# Altium footprint library ACTION标准库.pcblib: 504 footprints (part 14 of 32)
Each footprint in its own frame and in the unit in brackets; x right, y up, seen from the top. Pads: shape width x height; smd on the part's side, far side on the other; paste and mask are expansions set on the pad; w line width, h text height; cw(c..) or ccw(c..) is an arc to the next point about the centre after c.
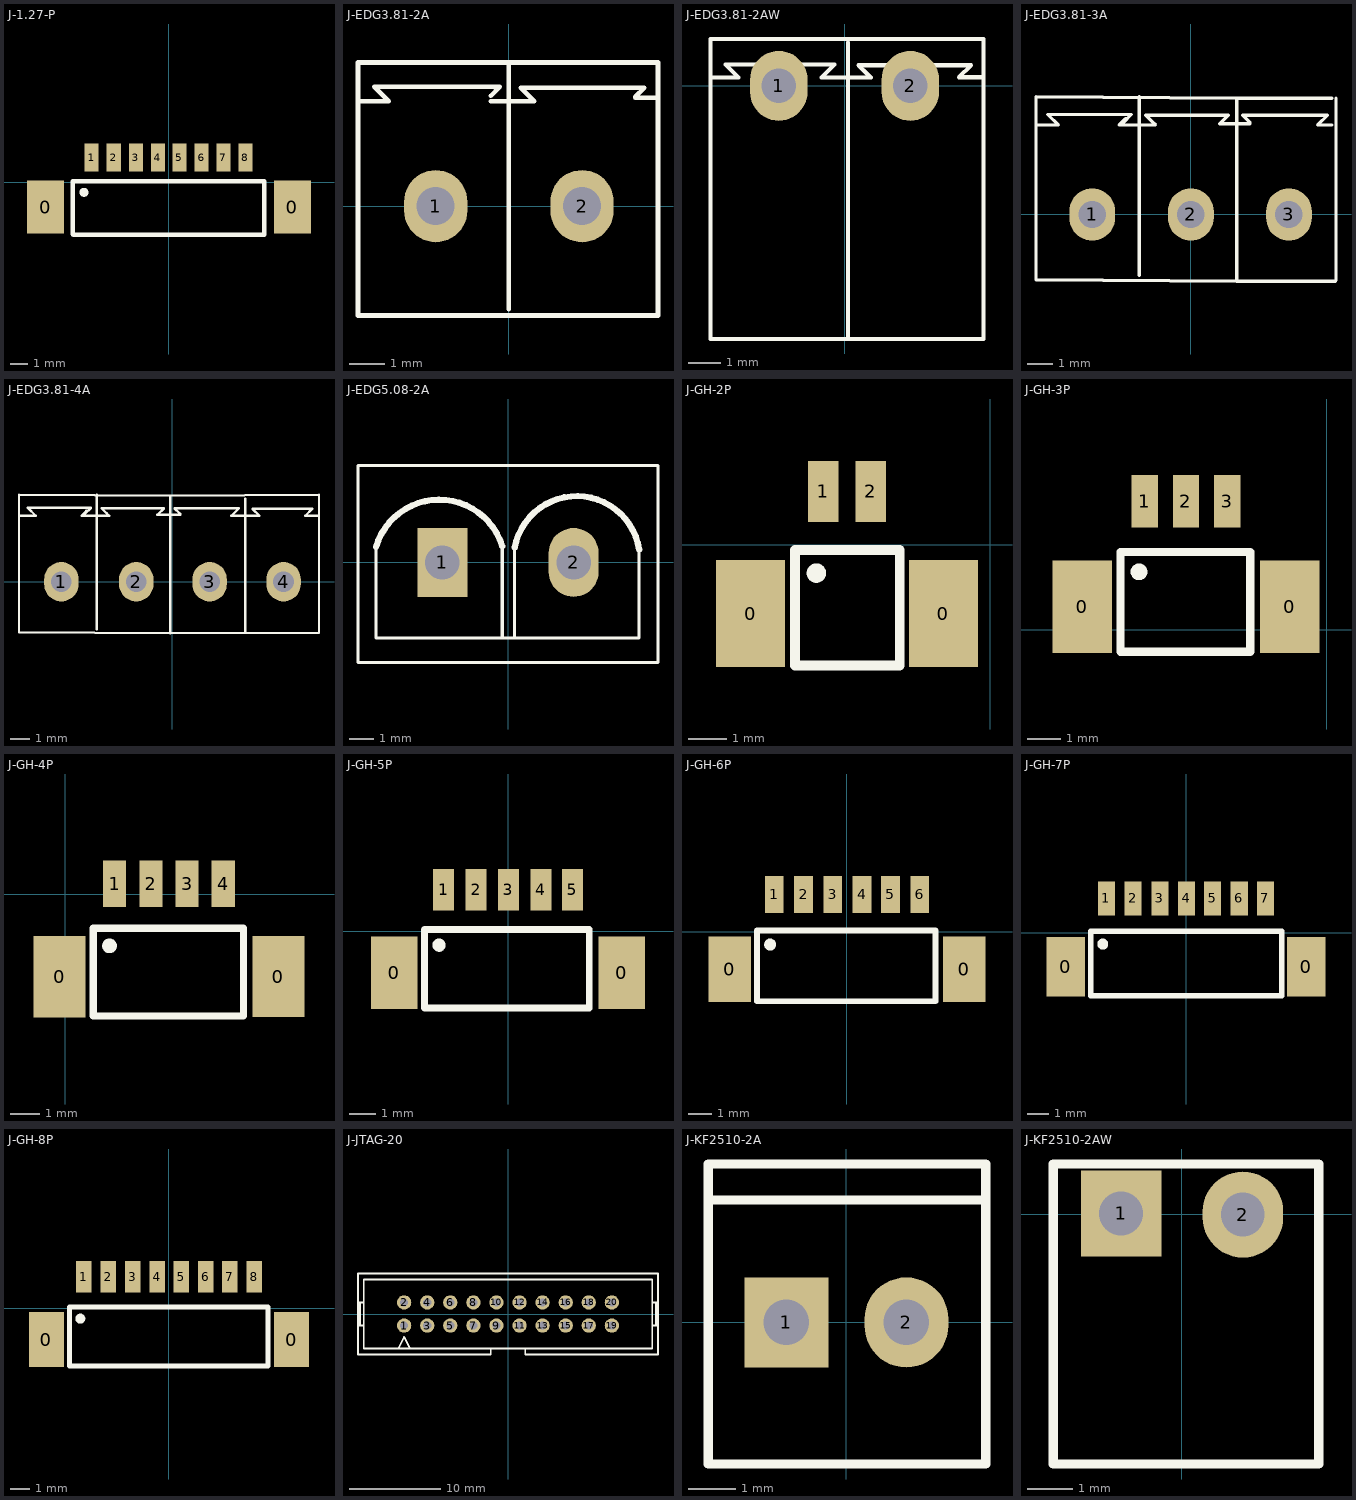
[diagram p13: the footprints below, top view; thin cyan lines are the x and y axes]

## J-1.27-P [mm]
pads (10):
  rect 2.1x3 smd: 0(-6.972,-1.399) 0(6.972,-1.402)
  rect 0.8x1.6 smd: 1(-4.371,1.402) 2(-3.121,1.402) 3(-1.871,1.402) 4(-0.622,1.402) 5(0.592,1.402) 6(1.842,1.402) 7(3.069,1.402) 8(4.319,1.402)
Top Overlay:
  circle w0.254: c-4.801,-0.564 r0.127
  lines w0.254: -5.436,-2.928 -5.411,-2.954 5.371,-2.954 5.371,0.069 -5.436,0.069 -5.436,-2.928
3D body "CH1.25-8P-SMD.STEP": height 3.5, standoff 0, extent -7.779,-3.699 7.371,1.501

## J-EDG3.81-2A [mil]
pads (2):
  oval 70x80 hole 42: 1(-81,0) 2(81,0)
Top Overlay:
  lines w5: -167,116 -133,116 -149,132 -10,132 -20,122 ; -20,116 16,116 28,116 23,121 13,131 150,131 140,121 140,120 164,120 ; 0,-114 0,159 ; -167,-121 165,-121 165,159 -167,159 -167,-121
3D body "小绿头2.STEP": height 354.33, standoff -137.8, extent -168,-122 166.65,158

## J-EDG3.81-2AW [mil]
height 68.9
pads (2):
  oval 70x85 hole 42: 1(-80,0) 2(80,0)
Top Overlay:
  lines w5: -163,10 -129,10 -145,26 -12,26 -28,10 32,10 27,15 17,25 154,25 139.5,10.5 167.5,10.5 ; 4,-305 4,53 ; -163,-308 169,-308 169,57 -163,57 -163,-308
3D body "66361.stp": height 287.4, standoff -102.36, extent -173.99,-305.55 180.74,56.66

## J-EDG3.81-3A [mil]
pads (3):
  oval 70x80 hole 42: 1(-151,0) 2(0,0) 3(150,0)
Top Overlay:
  lines w5: -237,137 -203,137 -219,153 -104,153 -91,153 -103,141 ; -97.22,146.78 -100.22,146.78 -110,137 -90,137 -54,137 -59,142 -69,152 57,152 44,139 90,139 90,141 79,152 209,152 194,137 216,137 ; -79,-93 -79,180 ; 70,141 70,142 ; 216,178 70,178 ; 221,-102 70,-102 ; 222,-101 222,172 222,178 ; 70,-102 70,178 ; 70,-102 -237,-100 -237,180 70,178
3D body "3-3.81修改.STEP": height 354.33, standoff -118.11, extent -250.99,-109.56 238.99,193

## J-EDG3.81-4A [mil]
pads (4):
  oval 70x80 hole 42: 1(-225.5,0) 2(-73.5,0) 3(75.5,0) 4(225.5,0)
Top Overlay:
  lines w5: -311.5,134 -277.5,134 -293.5,150 -178.5,150 -165.5,150 -177.5,138 ; -171.72,143.78 -174.72,143.78 -184.5,134 -164.5,134 -128.5,134 -133.5,139 -143.5,149 -17.5,149 -30.5,136 15.5,136 15.5,138 4.5,149 134.5,149 119.5,134 176.5,134 162.5,148 283.5,148 269.5,134 297.5,134 ; -153.5,-96 -153.5,177 ; -4.5,138 -4.5,139 ; 147.5,-104 147.5,169 ; -4.5,-105 297.5,-103.31 297.5,176.69 -4.5,175 ; -4.5,-105 -311.5,-103 -311.5,177 -4.5,175 ; -4.5,-105 -4.5,175

## J-EDG5.08-2A [mil]
pads (2):
  rect 80x110.24 hole 55: 1(-105,0)
  oval 80x110.24 hole 55: 2(105,0)
Top Overlay:
  lines w5: -211.19,24.76 -211.19,-120.81 209.88,-120.81 209.88,20.77 ; -9.19,-117.62 -9.19,26.02 ; 10.67,-120.81 10.67,23.92 ; -240,-160 240,-160 240,155 -30,155 -240,155 -240,-160
  lines w10: -211.19,24.76 cw(c-110,-5) -9.19,26.02 ; 10.67,23.92 cw(c110,5) 209.88,20.77
3D body "大绿头.STEP": height 354.33, standoff -39.37, extent -234.22,-157.96 238.22,157

## J-GH-2P [mm]
pads (4):
  rect 1.8x2.8 smd: 0(-6.27,-1.8) 0(-1.221,-1.8)
  rect 0.8x1.6 smd: 1(-4.371,1.402) 2(-3.121,1.402)
Top Overlay:
  circle w0.254: c-4.547,-0.737 r0.127
  lines w0.254: -5.105,-3.157 -5.105,-0.134 -2.362,-0.134 -2.362,-3.157 -5.105,-3.157
3D body "SM02B-GHS-TB.stp": height 4.25, standoff -0.05, extent -6.639,-3.224 -0.889,1.626

## J-GH-3P [mm]
pads (5):
  rect 1.8x2.8 smd: 0(-7.413,0.689) 0(-1.114,0.691)
  rect 0.8x1.6 smd: 1(-5.514,3.891) 2(-4.264,3.891) 3(-3.014,3.891)
Top Overlay:
  circle w0.254: c-5.69,1.753 r0.127
  lines w0.254: -6.248,-0.668 -2.311,-0.668 -2.311,2.355 -6.248,2.355 -6.248,-0.668

## J-GH-4P [mm]
pads (6):
  rect 1.8x2.8 smd: 0(-0.199,-2.841) 0(7.349,-2.839)
  rect 0.8x1.6 smd: 1(1.699,0.361) 2(2.949,0.361) 3(4.199,0.361) 4(5.449,0.361)
Top Overlay:
  circle w0.254: c1.524,-1.778 r0.127
  lines w0.254: 0.965,-4.198 6.147,-4.198 6.147,-1.176 0.965,-1.176 0.965,-4.198
3D body "SM04B-GHS-TB.stp": height 4.25, standoff -0.05, extent -0.503,-4.266 7.747,0.584

## J-GH-5P [mm]
pads (7):
  rect 1.8x2.8 smd: 0(-4.381,-1.601) 0(4.381,-1.599)
  rect 0.8x1.6 smd: 1(-2.483,1.601) 2(-1.233,1.601) 3(0.017,1.601) 4(1.267,1.601) 5(2.481,1.601)
Top Overlay:
  circle w0.254: c-2.658,-0.538 r0.127
  lines w0.254: -3.217,-2.958 3.133,-2.958 3.133,0.065 -3.217,0.065 -3.217,-2.958
3D body "SM05B-GHS-TB.stp": height 4.35, standoff 0.05, extent -4.724,-3.015 4.776,1.835

## J-GH-6P [mm]
pads (8):
  rect 1.8x2.8 smd: 0(-5.006,-1.601) 0(5.006,-1.599)
  rect 0.8x1.6 smd: 1(-3.108,1.601) 2(-1.858,1.601) 3(-0.608,1.601) 4(0.642,1.601) 5(1.856,1.601) 6(3.106,1.601)
Top Overlay:
  circle w0.254: c-3.283,-0.538 r0.127
  lines w0.254: -3.842,-2.958 -3.842,0.065 3.778,0.065 3.778,-2.958 -3.842,-2.958
3D body "SM06B-GHS-TB.stp": height 4.45, standoff 0.15, extent -5.289,-2.996 5.461,1.854

## J-GH-7P [mm]
pads (9):
  rect 1.8x2.8 smd: 0(-5.619,-1.601) 0(5.619,-1.599)
  rect 0.8x1.6 smd: 1(-3.721,1.601) 2(-2.471,1.601) 3(-1.221,1.601) 4(0.029,1.601) 5(1.243,1.601) 6(2.493,1.601) 7(3.72,1.601)
Top Overlay:
  circle w0.254: c-3.896,-0.538 r0.127
  lines w0.254: -4.455,-2.958 -4.455,0.065 4.486,0.065 4.486,-2.958 -4.455,-2.958
3D body "SM07B-GHS-TB.stp": height 4.45, standoff 0.15, extent -6.025,-3.041 5.975,1.809

## J-GH-8P [mm]
pads (10):
  rect 1.8x2.8 smd: 0(-6.244,-1.601) 0(6.245,-1.601)
  rect 0.8x1.6 smd: 1(-4.346,1.601) 2(-3.096,1.601) 3(-1.846,1.601) 4(-0.596,1.601) 5(0.618,1.601) 6(1.868,1.601) 7(3.094,1.601) 8(4.344,1.601)
Top Overlay:
  circle w0.254: c-4.521,-0.538 r0.127
  lines w0.254: -5.08,-2.958 -5.08,0.065 5.055,0.065 5.055,-2.958 -5.08,-2.958
3D body "SM08B-GHS-TB.stp": height 4.45, standoff 0.15, extent -6.65,-2.996 6.6,1.854

## J-JTAG-20 [mil]
pads (20):
  round 62 hole 35: 1(-450,-50) 2(-450,50) 3(-350,-50) 4(-350,50) 5(-250,-50) 6(-250,50) 7(-150,-50) 8(-150,50) 9(-50,-50) 10(-50,50) 11(50,-50) 12(50,50) 13(150,-50) 14(150,50) 15(250,-50) 16(250,50) 17(350,-50) 18(350,50) 19(450,-50) 20(450,50)
Top Overlay:
  lines w8: -650,-50 -625,-50 ; -650,50 -625,50 ; -641.67,-50 -641.67,50 ; -475,-150 -450,-100 -425,-150 ; -339.57,-175 -75,-175 -75,-150 ; -325,-175 -650,-175 -650,175 650,175 650,-175 325,-175 75,-175 75,-150 ; 625,-50 650,-50 ; 625,50 650,50 ; 641.67,-50 641.67,50 ; -75,-150 75,-150 ; -75,-150 -625,-150 -625,150 625,150 625,-150 75,-150
3D body "BH-20.STEP": height 348.1, standoff -129.92, extent -636,-179 665.57,183.2

## J-KF2510-2A [mil]
pads (2):
  rect 70x75.06 hole 38: 1(-50,0)
  oval 70x75.06 hole 38: 2(50,0)
Top Overlay:
  lines w7.87: -115,102 116,102 ; -115,-118 -115,132 116,132 116,-118 -115,-118
3D body "KF2510 2PIN直针.STEP": height 420.74, standoff -139.1, extent -99,-121 101,129

## J-KF2510-2AW [mil]
pads (2):
  rect 70x75.06 hole 38: 1(-53,0.5)
  oval 70x75.06 hole 38: 2(53,-0.5)
Top Overlay:
  lines w7.87: -112,-217.5 119,-217.5 119,43.5 -112,43.5 -112,-217.5
3D body "KF2510 2PIN.stp": height 229.17, standoff -93.66, extent -99.99,-517.87 100.01,14.41